# Altium footprint library UWRT Footprint Library.PcbLib: 258 footprints (part 5 of 17)
Each footprint in its own frame and in the unit in brackets; x right, y up, seen from the top. Pads: shape width x height; smd on the part's side, far side on the other; paste and mask are expansions set on the pad; w line width, h text height; cw(c..) or ccw(c..) is an arc to the next point about the centre after c.
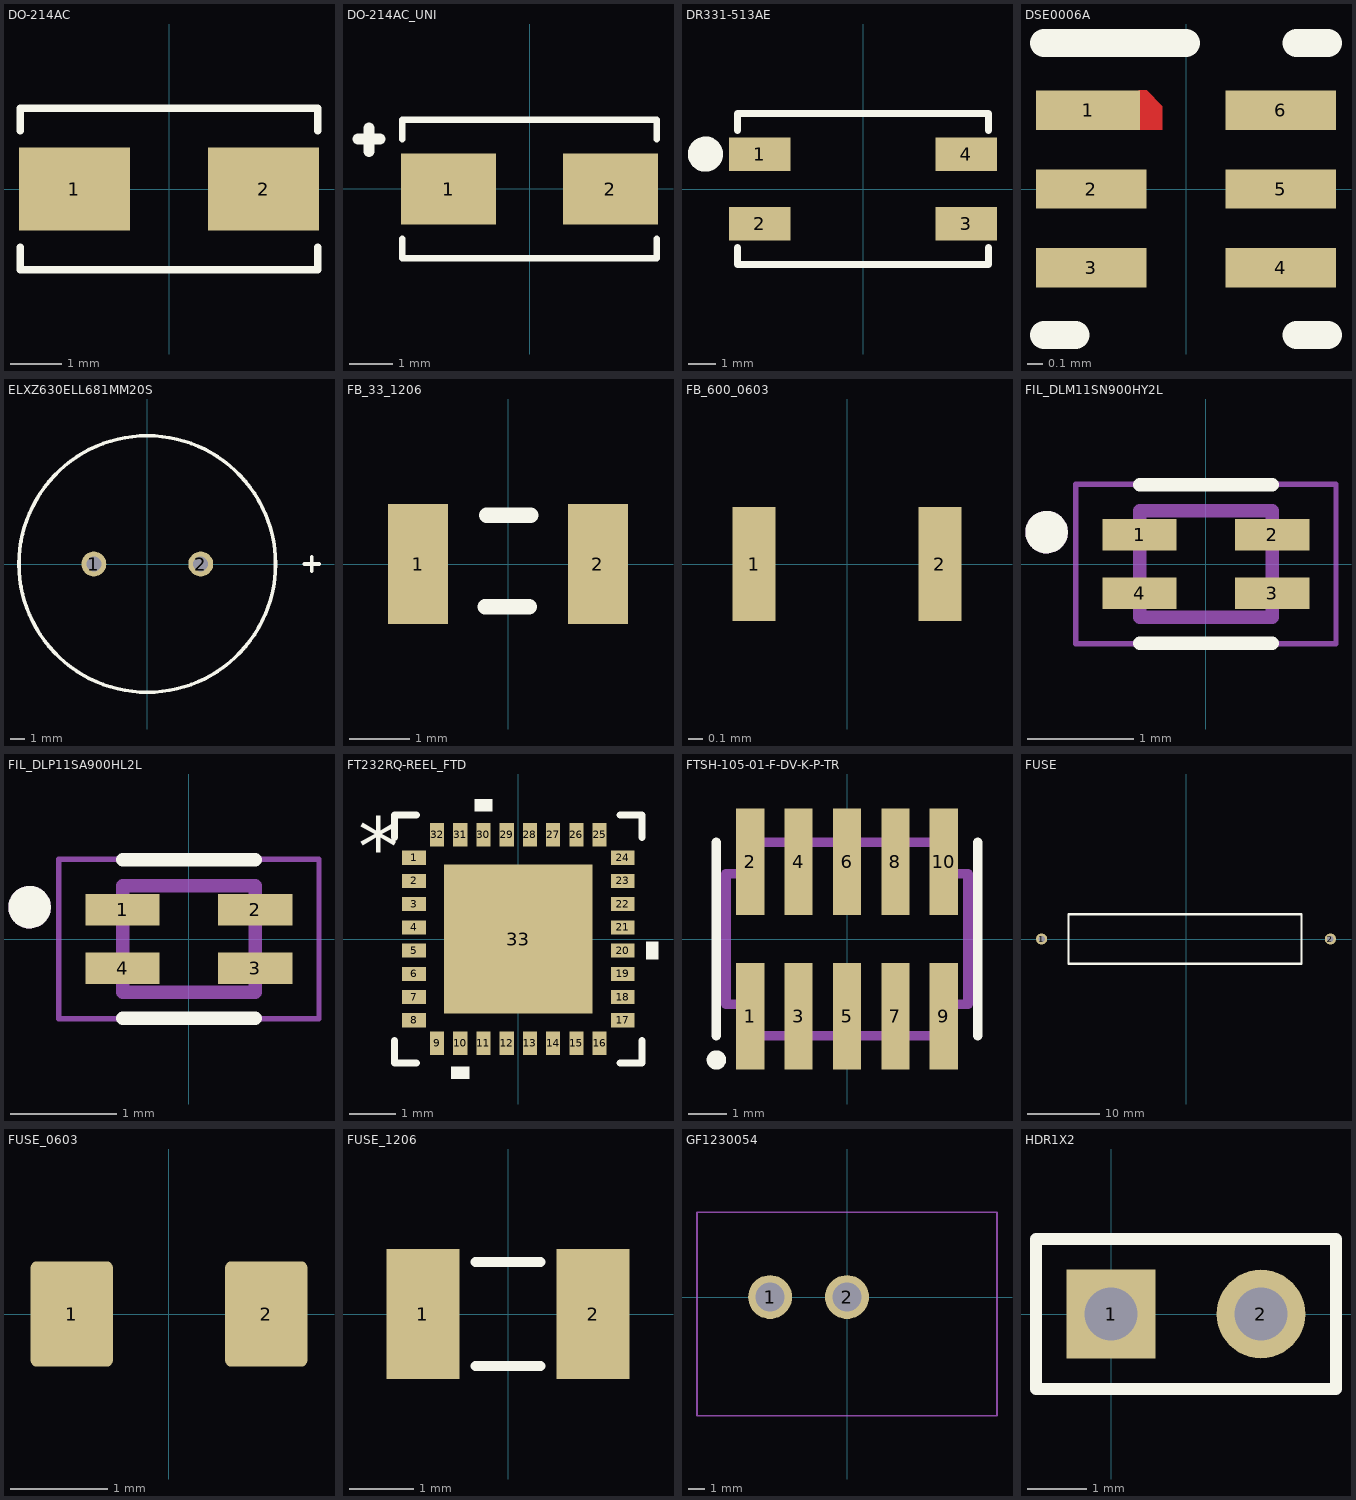
[diagram p4: the footprints below, top view; thin cyan lines are the x and y axes]

## DO-214AC [mm] "SMA"
pads (2):
  rect 2.18x1.63 smd: 1(-1.857,0) 2(1.857,0)
Top Overlay:
  lines w0.152: -2.922,-1.148 -2.922,-1.587 2.922,-1.587 2.922,-1.148 ; -2.922,1.148 -2.922,1.587 2.922,1.587 2.922,1.148
3D body "User Library-DO-214AC SMA.step": height 2.38, standoff -0.02, extent -2.6,-1.3 2.6,1.3
3D body: height 0.25, standoff 0, extent 0,0 0.254,0.254

## DO-214AC_UNI [mm]
pads (2):
  rect 2.18x1.63 smd: 1(-1.857,0) 2(1.857,0)
Top Overlay:
  lines w0.152: -2.922,-1.148 -2.922,-1.587 2.922,-1.587 2.922,-1.148 ; -2.922,1.148 -2.922,1.587 2.922,1.587 2.922,1.148
  lines w0.254: -3.937,1.148 -3.429,1.148 ; -3.683,0.864 -3.683,1.402
3D body "User Library-DO-214AC SMA.step": height 2.38, standoff -0.02, extent -2.6,-1.3 2.6,1.3
3D body: height 0.25, standoff 0, extent 0,0 0.254,0.254

## DR331-513AE [mm] "CMC"
height 3.7
pads (4):
  rect 2.2x1.2 smd: 1(-3.7,1.25) 2(-3.7,-1.25) 3(3.7,-1.25) 4(3.7,1.25)
Top Overlay:
  circle w0.654: c-5.65,1.25 r0.304
  lines w0.254: -4.5,-2.1 -4.5,-2.7 4.5,-2.7 4.5,-2.1 ; -4.5,2.1 -4.5,2.7 4.5,2.7 4.5,2.1
3D body "dr331.stp": height 5.01, standoff 0.01, extent -4.5,-2.7 4.5,2.7

## DSE0006A [mm]
pads (6):
  rect 0.66x0.25 smd paste+0 mask+0.051: 1(-0.62,0.5)
  rect 0.7x0.25 smd paste+0 mask+0.051: 2(-0.6,0) 3(-0.6,-0.5) 4(0.6,-0.5) 5(0.6,0) 6(0.6,0.5)
Top Layer:
  region: -0.3,0.375 -0.3,0.625 -0.25,0.625 -0.15,0.525 -0.15,0.375
Top Overlay:
  lines w0.178: -0.9,-0.925 -0.7,-0.925 ; -0.9,0.925 0,0.925 ; 0.7,-0.925 0.9,-0.925 ; 0.7,0.925 0.9,0.925
Top Paste:
  region: -0.3,0.375 -0.3,0.625 -0.25,0.625 -0.15,0.525 -0.15,0.375
Top Solder:
  region: -0.351,0.375 -0.351,0.625 -0.35,0.635 -0.347,0.644 -0.342,0.653 -0.336,0.661 -0.328,0.667 -0.319,0.672 -0.31,0.675 -0.3,0.676 -0.25,0.676 -0.24,0.675 -0.231,0.672 -0.222,0.667 -0.214,0.661 -0.114,0.561 -0.108,0.553 -0.103,0.544 -0.1,0.535 -0.099,0.525 -0.099,0.375 -0.1,0.365 -0.103,0.356 -0.108,0.347 -0.114,0.339 -0.122,0.333 -0.131,0.328 -0.14,0.325 -0.15,0.324 -0.3,0.324 -0.31,0.325 -0.319,0.328 -0.328,0.333 -0.336,0.339 -0.342,0.347 -0.347,0.356 -0.35,0.365

## ELXZ630ELL681MM20S [mm] "CAP ALUM 680UF 20% 63V RADIAL"
pads (2):
  round 1.75 hole 1.05: 1(-3.75,0) 2(3.75,0)
Top Overlay:
  circle w0.254: c0,0 r9
  lines w0.254: 11.032,0 12.048,0 ; 11.54,-0.508 11.54,0.508

## FB_33_1206 [mm]
pads (2):
  rect 1x2 smd: 1(-1.5,0) 2(1.5,0)
Top Overlay:
  lines w0.254: -0.382,-0.711 0.354,-0.711 ; -0.357,0.813 0.38,0.813

## FB_600_0603 [mm] "FERRITE BEAD 600 OHM 0603 1LN"
pads (2):
  rect 0.3x0.8 smd: 1(-0.65,0) 2(0.65,0)
3D body "User Library-FB_1608.STEP": height 0.8, standoff 0, extent -0.8,-0.4 0.8,0.4

## FIL_DLM11SN900HY2L [mm]
pads (4):
  rect 0.7x0.3 smd: 1(-0.625,0.275) 2(0.625,0.275) 3(0.625,-0.275) 4(-0.625,-0.275)
Top Overlay:
  circle w0.2: c-1.5,0.3 r0.1
  lines w0.127: -0.625,-0.745 0.625,-0.745 ; -0.625,0.745 0.625,0.745
Mechanical 13:
  circle w0.2: c-1.5,0.3 r0.1
  lines w0.127: -0.625,-0.5 0.625,-0.5 0.625,0.5 -0.625,0.5 -0.625,-0.5
Mechanical 15:
  lines w0.05: -1.225,-0.75 1.225,-0.75 1.225,0.75 -1.225,0.75 -1.225,-0.75
3D body "DLM11SN900HY2L.STEP": height 0.6, standoff 0, extent -0.625,-0.5 0.625,0.5

## FIL_DLP11SA900HL2L [mm]
pads (4):
  rect 0.7x0.3 smd: 1(-0.625,0.275) 2(0.625,0.275) 3(0.625,-0.275) 4(-0.625,-0.275)
Top Overlay:
  circle w0.2: c-1.5,0.3 r0.1
  lines w0.127: -0.625,-0.745 0.625,-0.745 ; -0.625,0.745 0.625,0.745
Mechanical 13:
  circle w0.2: c-1.5,0.3 r0.1
  lines w0.127: -0.625,-0.5 0.625,-0.5 0.625,0.5 -0.625,0.5 -0.625,-0.5
Mechanical 15:
  lines w0.05: -1.225,-0.75 1.225,-0.75 1.225,0.75 -1.225,0.75 -1.225,-0.75
3D body "step_temp.STEP": height 0.92, standoff 0, extent -0.625,-0.5 0.625,0.5

## FT232RQ-REEL_FTD [mil]
pads (33):
  rect 20x12 smd paste+0 mask+0: 1(-88.43,68.9) 2(-88.43,49.21) 3(-88.43,29.53) 4(-88.43,9.84) 5(-88.43,-9.84) 6(-88.43,-29.53) 7(-88.43,-49.21) 8(-88.43,-68.9) 17(88.43,-68.9) 18(88.43,-49.21) 19(88.43,-29.53) 20(88.43,-9.84) 21(88.43,9.84) 22(88.43,29.53) 23(88.43,49.21) 24(88.43,68.9)
  rect 12x20 smd paste+0 mask+0: 9(-68.9,-88.43) 10(-49.21,-88.43) 11(-29.53,-88.43) 12(-9.84,-88.43) 13(9.84,-88.43) 14(29.53,-88.43) 15(49.21,-88.43) 16(68.9,-88.43) 25(68.9,88.43) 26(49.21,88.43) 27(29.53,88.43) 28(9.84,88.43) 29(-9.84,88.43) 30(-29.53,88.43) 31(-49.21,88.43) 32(-68.9,88.43)
  rect 126x126 smd paste-62.5 mask+0: 33(0,0)
Top Overlay:
  region: -41.71,-108.43 -56.71,-108.43 -56.71,-118.43 -41.71,-118.43
  region: 108.43,-2.34 118.43,-2.34 118.43,-17.34 108.43,-17.34
  region: -22.03,108.43 -37.03,108.43 -37.03,118.43 -22.03,118.43
  lines w6: -105,-86.23 -105,-105 -86.23,-105 ; -105,86.23 -105,105 -86.23,105 ; 86.23,-105 105,-105 105,-86.23 ; 86.23,105 105,105 105,86.23
  text "*" at -135.93,53.74 h50
Top Paste:
  region: -3.94,59.06 -59.06,59.06 -59.06,3.94 -3.94,3.94
  region: -3.94,-3.94 -59.06,-3.94 -59.06,-59.06 -3.94,-59.06
  region: 59.06,59.06 3.94,59.06 3.94,3.94 59.06,3.94
  region: 59.06,-3.94 3.94,-3.94 3.94,-59.06 59.06,-59.06
3D body "FT232RQ-REEL_FTD.step": height 65.12, standoff 0, extent -99.99,-99.99 100.01,100.01

## FTSH-105-01-F-DV-K-P-TR [mil] "Samtec programming header 10 positions"
pads (10):
  rect 29x110 smd mask+2: 1(-100,-80) 2(-100,80) 3(-50,-80) 4(-50,80) 5(0,-80) 6(0,80) 7(50,-80) 8(50,80) 9(100,-80) 10(100,80)
Top Overlay:
  circle w10: c-135,-125 r5
  lines w10: -135,-100 -135,100 ; 135,-100 135,100
Mechanical 1:
  lines w10: -125,-67.5 -125,67.5 -100,67.5 -100,100 100,100 100,67.5 125,67.5 125,-67.5 100,-67.5 100,-100 -100,-100 -100,-67.5 -125,-67.5
3D body "FTSH-105-01-F-DV-K-P-TR.stp": height 275.5, standoff 0.5, extent -125,-175.01 124.99,115

## FUSE [mm] "0324015.HXP"
pads (2):
  round 1.55 hole 0.9: 1(-20,0) 2(20,0)
Top Overlay:
  lines w0.305: -16.256,-3.429 16.012,-3.429 16.012,3.429 -16.256,3.429 -16.256,-3.429
3D body "User Library-Fuse-2.STEP": height 6.36, standoff 0.01, extent -16.002,-3.175 15.758,3.175

## FUSE_0603 [mm] "Chip Fuse, Body 1.6x0.81mm"
height 0.305
pads (2):
  rrect15% 0.85x1.09 smd: 1(-1.005,0) 2(1.005,0)
3D body "User Library-ptc06032-1.STEP": height 0.75, standoff 0, extent -0.8,-0.375 0.8,0.375

## FUSE_1206 [mil]
pads (2):
  rect 45x80 smd mask+1: 1(-52.5,0) 2(52.5,0)
Top Overlay:
  lines w6: -20,-32.08 20,-32.08 ; -20,32.09 20,32.09
3D body "Fuse Littelfuse 1206L150THWR.stp": height 31.98, standoff -0.5, extent -65.04,-32.08 65.04,32.09

## GF1230054 [mm]
pads (2):
  round 2.625 / inner round 1.524 / far side round 2.625 hole 1.75 mask+0.203: 1(-4.6,0) 2(0,0)
Mechanical 15:
  lines w0.1: -8.975,-7.096 -8.975,5.064 8.975,5.064 8.975,-7.096 -8.975,-7.096
3D body "GF-123-0054_3D Model.stp": height 16.61, standoff -1.62, extent -8.204,-6.223 8.255,3.937

## HDR1X2 [mm] "Connector; Header; 2 Position"
pads (2):
  rect 1.5x1.5 hole 0.9: 1(0,0)
  round 1.5 hole 0.9: 2(2.54,0)
Top Overlay:
  lines w0.2: -1.27,-1.27 3.81,-1.27 3.81,1.27 -1.27,1.27 -1.27,-1.27
3D body "CircuitWorks-HDR1X2.step": height 6.35, standoff -5.84, extent -1.27,-1.27 3.81,1.27